# Altium schematic symbol library Analog Devices Data Converters Digital-to-Analog Converters.SchLib: 2231 symbols (part 58 of 135) (continued)
## AD5570ARS
designator U?
Single 16-Bit True Accuracy Digital-to-Analog Converter with Serial Interface, + / -12 V , + / -15 V, -40 to +85 degC, RS-16, Tube; Generic Part Number: AD5570; Manufacturer: Analog Devices; PartNumber: AD5570ARS; # DAC Outputs: 1; Max V+: 16.5V; Op Pwr Diss: 150mW; Resolution (Bits): 16; Settling Time: 12µs; Single Supply: No; DatasheetVersion: Rev.C; PackageVersion: Mar-2005; PackageReference: RS-16; PackageDescription: 16-Lead Shrink Small Outline Package [SSOP]; Supplier 1: Digi-Key; Supplier Part Number 1: AD5570ARS-ND; Supplier 2: Mouser; Supplier Part Number 2: 584-AD5570ARS; Packing: Tube; RoHS: N; Mounting Technology: Surface Mount; Code_JEDEC: MO-150-AC; ComponentLink1Description: Manufacturer URL; ComponentLink1URL: http://www.analog.com/en/index.html; ComponentLink2Description: Datasheet; ComponentLink2URL: http://www.analog.com/static/imported-files/data_sheets/AD5570.pdf; ComponentLink3Description: Package Specification; ComponentLink3URL: http://www.analog.com/static/imported-files/packages/31572257652246RS_16.pdf; ComponentLink4Description: Product URL; ComponentLink4URL: http://www.analog.com/en/digital-to-analog-converters/da-converters/ad5570/products/product.html
footprint RS-16_N (SOP, 16-Leads, Body 6.2x5.3mm, Pitch 0.65mm, IPC Medium Density)
footprint RS-16_L (SOP, 16-Leads, Body 6.2x5.3mm, Pitch 0.65mm, IPC High Density)
footprint RS-16_M (SOP, 16-Leads, Body 6.2x5.3mm, Pitch 0.65mm, IPC Low Density)
pins: 1 VSS (power) "Negative Analog Supply Voltage. -12 V +/- 5% to -15 V +/- 10% for specified performance", 2 VDD (power) "Positive Analog Supply Voltage. 12 V +/- 5% to 15 V +/- 10% for specified performance", 3 ~{CLR} (in) "Level Sensitive, Active Low Input. A falling edge of C\L\R\ resets VOUT to AGND. The contents of the registers are untouched.", 4 ~{LDAC} (in) "Active Low Control Input. Transfers the contents of the input register to the DAC register. L\D\A\C\ can be tied permanently low, enabling the outputs to be updated on the rising edge of S\Y\N\C\.", 5 ~{SYNC} (in) "Active Low Control Input. This is the frame synchronization signal for the data. When S\Y\N\C\ goes low, it powers on the SCLK and SDIN buffers and enables the input shift register. Data is transferred in on the falling (See Datasheet)", 6 SCLK (in) "Serial Clock Input. Data is clocked into the input register on the falling edge of the serial clock input. Data can be transferred at rates of up to 8 MHz.", 7 SDIN (in) "Serial Data Input. Data is clocked into the 16-bit register on the falling edge of the serial clock input.", 8 SDO (oc) "Serial Data Output. Can be used for daisy-chaining a number of devices together or for reading back the data in the shift register for diagnostic purposes. This is an open-drain output; it must be pulled to logic high with (See Datasheet)", 9 DGND (power) "Digital Ground. Ground reference for all digital circuitry.", 10 ~{PD} (in) "Active Low Control Input. Allows the DAC to be put into a power-down state.", 11 AGND (power) "Analog Ground. Ground reference for all analog circuitry.", 12 AGNDS (power) "Analog Ground Sense. This is normally tied to AGND.", 13 VOUT (out) "Analog Output Voltage.", 14 REFGND (power) "Reference Ground. Tie this pin to 0 V.", 15 REFIN (in) "Voltage Reference Input. This is internally buffered before being applied to the DAC. For bipolar +/-10 V output range, REFIN is 5 V.", 16 REFGND (power) "Reference Ground. Tie this pin to 0 V."

## AD5570ARS-REEL
designator U?
Single 16-Bit True Accuracy Digital-to-Analog Converter with Serial Interface, + / -12 V , + / -15 V, -40 to +85 degC, RS-16, Reel; Generic Part Number: AD5570; Manufacturer: Analog Devices; PartNumber: AD5570ARS-REEL; # DAC Outputs: 1; Max V+: 16.5V; Op Pwr Diss: 150mW; Resolution (Bits): 16; Settling Time: 12µs; Single Supply: No; DatasheetVersion: Rev.C; PackageVersion: Mar-2005; PackageReference: RS-16; PackageDescription: 16-Lead Shrink Small Outline Package [SSOP]; Supplier 1: Digi-Key; Supplier Part Number 1: AD5570ARS-REEL-ND; Supplier 2: Mouser; Supplier Part Number 2: 584-AD5570ARS-R; Packing: Reel; RoHS: N; Mounting Technology: Surface Mount; Code_JEDEC: MO-150-AC; ComponentLink1Description: Manufacturer URL; ComponentLink1URL: http://www.analog.com/en/index.html; ComponentLink2Description: Datasheet; ComponentLink2URL: http://www.analog.com/static/imported-files/data_sheets/AD5570.pdf; ComponentLink3Description: Package Specification; ComponentLink3URL: http://www.analog.com/static/imported-files/packages/31572257652246RS_16.pdf; ComponentLink4Description: Product URL; ComponentLink4URL: http://www.analog.com/en/digital-to-analog-converters/da-converters/ad5570/products/product.html
footprint RS-16_N (SOP, 16-Leads, Body 6.2x5.3mm, Pitch 0.65mm, IPC Medium Density)
footprint RS-16_L (SOP, 16-Leads, Body 6.2x5.3mm, Pitch 0.65mm, IPC High Density)
footprint RS-16_M (SOP, 16-Leads, Body 6.2x5.3mm, Pitch 0.65mm, IPC Low Density)
pins: 1 VSS (power) "Negative Analog Supply Voltage. -12 V +/- 5% to -15 V +/- 10% for specified performance", 2 VDD (power) "Positive Analog Supply Voltage. 12 V +/- 5% to 15 V +/- 10% for specified performance", 3 ~{CLR} (in) "Level Sensitive, Active Low Input. A falling edge of C\L\R\ resets VOUT to AGND. The contents of the registers are untouched.", 4 ~{LDAC} (in) "Active Low Control Input. Transfers the contents of the input register to the DAC register. L\D\A\C\ can be tied permanently low, enabling the outputs to be updated on the rising edge of S\Y\N\C\.", 5 ~{SYNC} (in) "Active Low Control Input. This is the frame synchronization signal for the data. When S\Y\N\C\ goes low, it powers on the SCLK and SDIN buffers and enables the input shift register. Data is transferred in on the falling (See Datasheet)", 6 SCLK (in) "Serial Clock Input. Data is clocked into the input register on the falling edge of the serial clock input. Data can be transferred at rates of up to 8 MHz.", 7 SDIN (in) "Serial Data Input. Data is clocked into the 16-bit register on the falling edge of the serial clock input.", 8 SDO (oc) "Serial Data Output. Can be used for daisy-chaining a number of devices together or for reading back the data in the shift register for diagnostic purposes. This is an open-drain output; it must be pulled to logic high with (See Datasheet)", 9 DGND (power) "Digital Ground. Ground reference for all digital circuitry.", 10 ~{PD} (in) "Active Low Control Input. Allows the DAC to be put into a power-down state.", 11 AGND (power) "Analog Ground. Ground reference for all analog circuitry.", 12 AGNDS (power) "Analog Ground Sense. This is normally tied to AGND.", 13 VOUT (out) "Analog Output Voltage.", 14 REFGND (power) "Reference Ground. Tie this pin to 0 V.", 15 REFIN (in) "Voltage Reference Input. This is internally buffered before being applied to the DAC. For bipolar +/-10 V output range, REFIN is 5 V.", 16 REFGND (power) "Reference Ground. Tie this pin to 0 V."

## AD5570ARSZ
designator U?
Single 16-Bit True Accuracy Digital-to-Analog Converter with Serial Interface, + / -12 V , + / -15 V, -40 to +85 degC, RS-16, Pb-Free, Tube; Generic Part Number: AD5570; Manufacturer: Analog Devices; PartNumber: AD5570ARSZ; # DAC Outputs: 1; Max V+: 16.5V; Op Pwr Diss: 150mW; Resolution (Bits): 16; Settling Time: 12µs; Single Supply: No; DatasheetVersion: Rev.C; PackageVersion: Mar-2005; PackageReference: RS-16; PackageDescription: 16-Lead Shrink Small Outline Package [SSOP]; Supplier 1: Digi-Key; Supplier Part Number 1: AD5570ARSZ-ND; Supplier 2: Farnell; Supplier Part Number 2: 2313472; Supplier 3: Newark; Supplier Part Number 3: 59K4235; Supplier 4: Mouser; Supplier Part Number 4: 584-AD5570ARSZ; Packing: Tube; RoHS: Y; Mounting Technology: Surface Mount; Code_JEDEC: MO-150-AC; ComponentLink1Description: Manufacturer URL; ComponentLink1URL: http://www.analog.com/en/index.html; ComponentLink2Description: Datasheet; ComponentLink2URL: http://www.analog.com/static/imported-files/data_sheets/AD5570.pdf; ComponentLink3Description: Package Specification; ComponentLink3URL: http://www.analog.com/static/imported-files/packages/31572257652246RS_16.pdf; ComponentLink4Description: Product URL; ComponentLink4URL: http://www.analog.com/en/digital-to-analog-converters/da-converters/ad5570/products/product.html
footprint RS-16_N (SOP, 16-Leads, Body 6.2x5.3mm, Pitch 0.65mm, IPC Medium Density)
footprint RS-16_L (SOP, 16-Leads, Body 6.2x5.3mm, Pitch 0.65mm, IPC High Density)
footprint RS-16_M (SOP, 16-Leads, Body 6.2x5.3mm, Pitch 0.65mm, IPC Low Density)
pins: 1 VSS (power) "Negative Analog Supply Voltage. -12 V +/- 5% to -15 V +/- 10% for specified performance", 2 VDD (power) "Positive Analog Supply Voltage. 12 V +/- 5% to 15 V +/- 10% for specified performance", 3 ~{CLR} (in) "Level Sensitive, Active Low Input. A falling edge of C\L\R\ resets VOUT to AGND. The contents of the registers are untouched.", 4 ~{LDAC} (in) "Active Low Control Input. Transfers the contents of the input register to the DAC register. L\D\A\C\ can be tied permanently low, enabling the outputs to be updated on the rising edge of S\Y\N\C\.", 5 ~{SYNC} (in) "Active Low Control Input. This is the frame synchronization signal for the data. When S\Y\N\C\ goes low, it powers on the SCLK and SDIN buffers and enables the input shift register. Data is transferred in on the falling (See Datasheet)", 6 SCLK (in) "Serial Clock Input. Data is clocked into the input register on the falling edge of the serial clock input. Data can be transferred at rates of up to 8 MHz.", 7 SDIN (in) "Serial Data Input. Data is clocked into the 16-bit register on the falling edge of the serial clock input.", 8 SDO (oc) "Serial Data Output. Can be used for daisy-chaining a number of devices together or for reading back the data in the shift register for diagnostic purposes. This is an open-drain output; it must be pulled to logic high with (See Datasheet)", 9 DGND (power) "Digital Ground. Ground reference for all digital circuitry.", 10 ~{PD} (in) "Active Low Control Input. Allows the DAC to be put into a power-down state.", 11 AGND (power) "Analog Ground. Ground reference for all analog circuitry.", 12 AGNDS (power) "Analog Ground Sense. This is normally tied to AGND.", 13 VOUT (out) "Analog Output Voltage.", 14 REFGND (power) "Reference Ground. Tie this pin to 0 V.", 15 REFIN (in) "Voltage Reference Input. This is internally buffered before being applied to the DAC. For bipolar +/-10 V output range, REFIN is 5 V.", 16 REFGND (power) "Reference Ground. Tie this pin to 0 V."

## AD5570ARSZ-REEL
designator U?
Single 16-Bit True Accuracy Digital-to-Analog Converter with Serial Interface, + / -12 V , + / -15 V, -40 to +85 degC, RS-16, Pb-Free, Reel; Generic Part Number: AD5570; Manufacturer: Analog Devices; PartNumber: AD5570ARSZ-REEL; # DAC Outputs: 1; Max V+: 16.5V; Op Pwr Diss: 150mW; Resolution (Bits): 16; Settling Time: 12µs; Single Supply: No; DatasheetVersion: Rev.C; PackageVersion: Mar-2005; PackageReference: RS-16; PackageDescription: 16-Lead Shrink Small Outline Package [SSOP]; Supplier 1: Digi-Key; Supplier Part Number 1: AD5570ARSZ-REEL-ND; Supplier 2: Mouser; Supplier Part Number 2: 584-AD5570ARSZ-R; Packing: Reel; RoHS: Y; Mounting Technology: Surface Mount; Code_JEDEC: MO-150-AC; ComponentLink1Description: Manufacturer URL; ComponentLink1URL: http://www.analog.com/en/index.html; ComponentLink2Description: Datasheet; ComponentLink2URL: http://www.analog.com/static/imported-files/data_sheets/AD5570.pdf; ComponentLink3Description: Package Specification; ComponentLink3URL: http://www.analog.com/static/imported-files/packages/31572257652246RS_16.pdf; ComponentLink4Description: Product URL; ComponentLink4URL: http://www.analog.com/en/digital-to-analog-converters/da-converters/ad5570/products/product.html
footprint RS-16_N (SOP, 16-Leads, Body 6.2x5.3mm, Pitch 0.65mm, IPC Medium Density)
footprint RS-16_L (SOP, 16-Leads, Body 6.2x5.3mm, Pitch 0.65mm, IPC High Density)
footprint RS-16_M (SOP, 16-Leads, Body 6.2x5.3mm, Pitch 0.65mm, IPC Low Density)
pins: 1 VSS (power) "Negative Analog Supply Voltage. -12 V +/- 5% to -15 V +/- 10% for specified performance", 2 VDD (power) "Positive Analog Supply Voltage. 12 V +/- 5% to 15 V +/- 10% for specified performance", 3 ~{CLR} (in) "Level Sensitive, Active Low Input. A falling edge of C\L\R\ resets VOUT to AGND. The contents of the registers are untouched.", 4 ~{LDAC} (in) "Active Low Control Input. Transfers the contents of the input register to the DAC register. L\D\A\C\ can be tied permanently low, enabling the outputs to be updated on the rising edge of S\Y\N\C\.", 5 ~{SYNC} (in) "Active Low Control Input. This is the frame synchronization signal for the data. When S\Y\N\C\ goes low, it powers on the SCLK and SDIN buffers and enables the input shift register. Data is transferred in on the falling (See Datasheet)", 6 SCLK (in) "Serial Clock Input. Data is clocked into the input register on the falling edge of the serial clock input. Data can be transferred at rates of up to 8 MHz.", 7 SDIN (in) "Serial Data Input. Data is clocked into the 16-bit register on the falling edge of the serial clock input.", 8 SDO (oc) "Serial Data Output. Can be used for daisy-chaining a number of devices together or for reading back the data in the shift register for diagnostic purposes. This is an open-drain output; it must be pulled to logic high with (See Datasheet)", 9 DGND (power) "Digital Ground. Ground reference for all digital circuitry.", 10 ~{PD} (in) "Active Low Control Input. Allows the DAC to be put into a power-down state.", 11 AGND (power) "Analog Ground. Ground reference for all analog circuitry.", 12 AGNDS (power) "Analog Ground Sense. This is normally tied to AGND.", 13 VOUT (out) "Analog Output Voltage.", 14 REFGND (power) "Reference Ground. Tie this pin to 0 V.", 15 REFIN (in) "Voltage Reference Input. This is internally buffered before being applied to the DAC. For bipolar +/-10 V output range, REFIN is 5 V.", 16 REFGND (power) "Reference Ground. Tie this pin to 0 V."

## AD5570ARSZ-REEL7
designator U?
Single 16-Bit True Accuracy Digital-to-Analog Converter with Serial Interface, + / -12 V , + / -15 V, -40 to +85 degC, RS-16, Pb-Free, Reel; Generic Part Number: AD5570; Manufacturer: Analog Devices; PartNumber: AD5570ARSZ-REEL7; # DAC Outputs: 1; Max V+: 16.5V; Op Pwr Diss: 150mW; Resolution (Bits): 16; Settling Time: 12µs; Single Supply: No; DatasheetVersion: Rev.C; PackageVersion: Mar-2005; PackageReference: RS-16; PackageDescription: 16-Lead Shrink Small Outline Package [SSOP]; Supplier 1: Digi-Key; Supplier Part Number 1: AD5570ARSZ-REEL7-ND; Supplier 2: Newark; Supplier Part Number 2: 59K4237; Supplier 3: Mouser; Supplier Part Number 3: 584-AD5570ARSZ-R7; Packing: Reel; RoHS: Y; Mounting Technology: Surface Mount; Code_JEDEC: MO-150-AC; ComponentLink1Description: Manufacturer URL; ComponentLink1URL: http://www.analog.com/en/index.html; ComponentLink2Description: Datasheet; ComponentLink2URL: http://www.analog.com/static/imported-files/data_sheets/AD5570.pdf; ComponentLink3Description: Package Specification; ComponentLink3URL: http://www.analog.com/static/imported-files/packages/31572257652246RS_16.pdf; ComponentLink4Description: Product URL; ComponentLink4URL: http://www.analog.com/en/digital-to-analog-converters/da-converters/ad5570/products/product.html
footprint RS-16_N (SOP, 16-Leads, Body 6.2x5.3mm, Pitch 0.65mm, IPC Medium Density)
footprint RS-16_L (SOP, 16-Leads, Body 6.2x5.3mm, Pitch 0.65mm, IPC High Density)
footprint RS-16_M (SOP, 16-Leads, Body 6.2x5.3mm, Pitch 0.65mm, IPC Low Density)
pins: 1 VSS (power) "Negative Analog Supply Voltage. -12 V +/- 5% to -15 V +/- 10% for specified performance", 2 VDD (power) "Positive Analog Supply Voltage. 12 V +/- 5% to 15 V +/- 10% for specified performance", 3 ~{CLR} (in) "Level Sensitive, Active Low Input. A falling edge of C\L\R\ resets VOUT to AGND. The contents of the registers are untouched.", 4 ~{LDAC} (in) "Active Low Control Input. Transfers the contents of the input register to the DAC register. L\D\A\C\ can be tied permanently low, enabling the outputs to be updated on the rising edge of S\Y\N\C\.", 5 ~{SYNC} (in) "Active Low Control Input. This is the frame synchronization signal for the data. When S\Y\N\C\ goes low, it powers on the SCLK and SDIN buffers and enables the input shift register. Data is transferred in on the falling (See Datasheet)", 6 SCLK (in) "Serial Clock Input. Data is clocked into the input register on the falling edge of the serial clock input. Data can be transferred at rates of up to 8 MHz.", 7 SDIN (in) "Serial Data Input. Data is clocked into the 16-bit register on the falling edge of the serial clock input.", 8 SDO (oc) "Serial Data Output. Can be used for daisy-chaining a number of devices together or for reading back the data in the shift register for diagnostic purposes. This is an open-drain output; it must be pulled to logic high with (See Datasheet)", 9 DGND (power) "Digital Ground. Ground reference for all digital circuitry.", 10 ~{PD} (in) "Active Low Control Input. Allows the DAC to be put into a power-down state.", 11 AGND (power) "Analog Ground. Ground reference for all analog circuitry.", 12 AGNDS (power) "Analog Ground Sense. This is normally tied to AGND.", 13 VOUT (out) "Analog Output Voltage.", 14 REFGND (power) "Reference Ground. Tie this pin to 0 V.", 15 REFIN (in) "Voltage Reference Input. This is internally buffered before being applied to the DAC. For bipolar +/-10 V output range, REFIN is 5 V.", 16 REFGND (power) "Reference Ground. Tie this pin to 0 V."

## AD5570BRS
designator U?
Single 16-Bit True Accuracy Digital-to-Analog Converter with Serial Interface, + / -12 V , + / -15 V, -40 to +85 degC, RS-16, Tube; Generic Part Number: AD5570; Manufacturer: Analog Devices; PartNumber: AD5570BRS; # DAC Outputs: 1; Max V+: 16.5V; Op Pwr Diss: 150mW; Resolution (Bits): 16; Settling Time: 12µs; Single Supply: No; DatasheetVersion: Rev.C; PackageVersion: Mar-2005; PackageReference: RS-16; PackageDescription: 16-Lead Shrink Small Outline Package [SSOP]; Supplier 1: Digi-Key; Supplier Part Number 1: AD5570BRS-ND; Supplier 2: Mouser; Supplier Part Number 2: 584-AD5570BRS; Packing: Tube; RoHS: N; Mounting Technology: Surface Mount; Code_JEDEC: MO-150-AC; ComponentLink1Description: Manufacturer URL; ComponentLink1URL: http://www.analog.com/en/index.html; ComponentLink2Description: Datasheet; ComponentLink2URL: http://www.analog.com/static/imported-files/data_sheets/AD5570.pdf; ComponentLink3Description: Package Specification; ComponentLink3URL: http://www.analog.com/static/imported-files/packages/31572257652246RS_16.pdf; ComponentLink4Description: Product URL; ComponentLink4URL: http://www.analog.com/en/digital-to-analog-converters/da-converters/ad5570/products/product.html
footprint RS-16_N (SOP, 16-Leads, Body 6.2x5.3mm, Pitch 0.65mm, IPC Medium Density)
footprint RS-16_L (SOP, 16-Leads, Body 6.2x5.3mm, Pitch 0.65mm, IPC High Density)
footprint RS-16_M (SOP, 16-Leads, Body 6.2x5.3mm, Pitch 0.65mm, IPC Low Density)
pins: 1 VSS (power) "Negative Analog Supply Voltage. -12 V +/- 5% to -15 V +/- 10% for specified performance", 2 VDD (power) "Positive Analog Supply Voltage. 12 V +/- 5% to 15 V +/- 10% for specified performance", 3 ~{CLR} (in) "Level Sensitive, Active Low Input. A falling edge of C\L\R\ resets VOUT to AGND. The contents of the registers are untouched.", 4 ~{LDAC} (in) "Active Low Control Input. Transfers the contents of the input register to the DAC register. L\D\A\C\ can be tied permanently low, enabling the outputs to be updated on the rising edge of S\Y\N\C\.", 5 ~{SYNC} (in) "Active Low Control Input. This is the frame synchronization signal for the data. When S\Y\N\C\ goes low, it powers on the SCLK and SDIN buffers and enables the input shift register. Data is transferred in on the falling (See Datasheet)", 6 SCLK (in) "Serial Clock Input. Data is clocked into the input register on the falling edge of the serial clock input. Data can be transferred at rates of up to 8 MHz.", 7 SDIN (in) "Serial Data Input. Data is clocked into the 16-bit register on the falling edge of the serial clock input.", 8 SDO (oc) "Serial Data Output. Can be used for daisy-chaining a number of devices together or for reading back the data in the shift register for diagnostic purposes. This is an open-drain output; it must be pulled to logic high with (See Datasheet)", 9 DGND (power) "Digital Ground. Ground reference for all digital circuitry.", 10 ~{PD} (in) "Active Low Control Input. Allows the DAC to be put into a power-down state.", 11 AGND (power) "Analog Ground. Ground reference for all analog circuitry.", 12 AGNDS (power) "Analog Ground Sense. This is normally tied to AGND.", 13 VOUT (out) "Analog Output Voltage.", 14 REFGND (power) "Reference Ground. Tie this pin to 0 V.", 15 REFIN (in) "Voltage Reference Input. This is internally buffered before being applied to the DAC. For bipolar +/-10 V output range, REFIN is 5 V.", 16 REFGND (power) "Reference Ground. Tie this pin to 0 V."

## AD5570BRS-REEL
designator U?
Single 16-Bit True Accuracy Digital-to-Analog Converter with Serial Interface, + / -12 V , + / -15 V, -40 to +85 degC, RS-16, Reel; Generic Part Number: AD5570; Manufacturer: Analog Devices; PartNumber: AD5570BRS-REEL; # DAC Outputs: 1; Max V+: 16.5V; Op Pwr Diss: 150mW; Resolution (Bits): 16; Settling Time: 12µs; Single Supply: No; DatasheetVersion: Rev.C; PackageVersion: Mar-2005; PackageReference: RS-16; PackageDescription: 16-Lead Shrink Small Outline Package [SSOP]; Supplier 1: Digi-Key; Supplier Part Number 1: AD5570BRS-REEL-ND; Supplier 2: Mouser; Supplier Part Number 2: 584-AD5570BRS-R; Packing: Reel; RoHS: N; Mounting Technology: Surface Mount; Code_JEDEC: MO-150-AC; ComponentLink1Description: Manufacturer URL; ComponentLink1URL: http://www.analog.com/en/index.html; ComponentLink2Description: Datasheet; ComponentLink2URL: http://www.analog.com/static/imported-files/data_sheets/AD5570.pdf; ComponentLink3Description: Package Specification; ComponentLink3URL: http://www.analog.com/static/imported-files/packages/31572257652246RS_16.pdf; ComponentLink4Description: Product URL; ComponentLink4URL: http://www.analog.com/en/digital-to-analog-converters/da-converters/ad5570/products/product.html
footprint RS-16_N (SOP, 16-Leads, Body 6.2x5.3mm, Pitch 0.65mm, IPC Medium Density)
footprint RS-16_L (SOP, 16-Leads, Body 6.2x5.3mm, Pitch 0.65mm, IPC High Density)
footprint RS-16_M (SOP, 16-Leads, Body 6.2x5.3mm, Pitch 0.65mm, IPC Low Density)
pins: 1 VSS (power) "Negative Analog Supply Voltage. -12 V +/- 5% to -15 V +/- 10% for specified performance", 2 VDD (power) "Positive Analog Supply Voltage. 12 V +/- 5% to 15 V +/- 10% for specified performance", 3 ~{CLR} (in) "Level Sensitive, Active Low Input. A falling edge of C\L\R\ resets VOUT to AGND. The contents of the registers are untouched.", 4 ~{LDAC} (in) "Active Low Control Input. Transfers the contents of the input register to the DAC register. L\D\A\C\ can be tied permanently low, enabling the outputs to be updated on the rising edge of S\Y\N\C\.", 5 ~{SYNC} (in) "Active Low Control Input. This is the frame synchronization signal for the data. When S\Y\N\C\ goes low, it powers on the SCLK and SDIN buffers and enables the input shift register. Data is transferred in on the falling (See Datasheet)", 6 SCLK (in) "Serial Clock Input. Data is clocked into the input register on the falling edge of the serial clock input. Data can be transferred at rates of up to 8 MHz.", 7 SDIN (in) "Serial Data Input. Data is clocked into the 16-bit register on the falling edge of the serial clock input.", 8 SDO (oc) "Serial Data Output. Can be used for daisy-chaining a number of devices together or for reading back the data in the shift register for diagnostic purposes. This is an open-drain output; it must be pulled to logic high with (See Datasheet)", 9 DGND (power) "Digital Ground. Ground reference for all digital circuitry.", 10 ~{PD} (in) "Active Low Control Input. Allows the DAC to be put into a power-down state.", 11 AGND (power) "Analog Ground. Ground reference for all analog circuitry.", 12 AGNDS (power) "Analog Ground Sense. This is normally tied to AGND.", 13 VOUT (out) "Analog Output Voltage.", 14 REFGND (power) "Reference Ground. Tie this pin to 0 V.", 15 REFIN (in) "Voltage Reference Input. This is internally buffered before being applied to the DAC. For bipolar +/-10 V output range, REFIN is 5 V.", 16 REFGND (power) "Reference Ground. Tie this pin to 0 V."

## AD5570BRS-REEL7
designator U?
Single 16-Bit True Accuracy Digital-to-Analog Converter with Serial Interface, + / -12 V , + / -15 V, -40 to +85 degC, RS-16, Reel; Generic Part Number: AD5570; Manufacturer: Analog Devices; PartNumber: AD5570BRS-REEL7; # DAC Outputs: 1; Max V+: 16.5V; Op Pwr Diss: 150mW; Resolution (Bits): 16; Settling Time: 12µs; Single Supply: No; DatasheetVersion: Rev.C; PackageVersion: Mar-2005; PackageReference: RS-16; PackageDescription: 16-Lead Shrink Small Outline Package [SSOP]; Supplier 1: Digi-Key; Supplier Part Number 1: AD5570BRS-REEL7-ND; Supplier 2: Mouser; Supplier Part Number 2: 584-AD5570BRS-R7; Packing: Reel; RoHS: N; Mounting Technology: Surface Mount; Code_JEDEC: MO-150-AC; ComponentLink1Description: Manufacturer URL; ComponentLink1URL: http://www.analog.com/en/index.html; ComponentLink2Description: Datasheet; ComponentLink2URL: http://www.analog.com/static/imported-files/data_sheets/AD5570.pdf; ComponentLink3Description: Package Specification; ComponentLink3URL: http://www.analog.com/static/imported-files/packages/31572257652246RS_16.pdf; ComponentLink4Description: Product URL; ComponentLink4URL: http://www.analog.com/en/digital-to-analog-converters/da-converters/ad5570/products/product.html
footprint RS-16_N (SOP, 16-Leads, Body 6.2x5.3mm, Pitch 0.65mm, IPC Medium Density)
footprint RS-16_L (SOP, 16-Leads, Body 6.2x5.3mm, Pitch 0.65mm, IPC High Density)
footprint RS-16_M (SOP, 16-Leads, Body 6.2x5.3mm, Pitch 0.65mm, IPC Low Density)
pins: 1 VSS (power) "Negative Analog Supply Voltage. -12 V +/- 5% to -15 V +/- 10% for specified performance", 2 VDD (power) "Positive Analog Supply Voltage. 12 V +/- 5% to 15 V +/- 10% for specified performance", 3 ~{CLR} (in) "Level Sensitive, Active Low Input. A falling edge of C\L\R\ resets VOUT to AGND. The contents of the registers are untouched.", 4 ~{LDAC} (in) "Active Low Control Input. Transfers the contents of the input register to the DAC register. L\D\A\C\ can be tied permanently low, enabling the outputs to be updated on the rising edge of S\Y\N\C\.", 5 ~{SYNC} (in) "Active Low Control Input. This is the frame synchronization signal for the data. When S\Y\N\C\ goes low, it powers on the SCLK and SDIN buffers and enables the input shift register. Data is transferred in on the falling (See Datasheet)", 6 SCLK (in) "Serial Clock Input. Data is clocked into the input register on the falling edge of the serial clock input. Data can be transferred at rates of up to 8 MHz.", 7 SDIN (in) "Serial Data Input. Data is clocked into the 16-bit register on the falling edge of the serial clock input.", 8 SDO (oc) "Serial Data Output. Can be used for daisy-chaining a number of devices together or for reading back the data in the shift register for diagnostic purposes. This is an open-drain output; it must be pulled to logic high with (See Datasheet)", 9 DGND (power) "Digital Ground. Ground reference for all digital circuitry.", 10 ~{PD} (in) "Active Low Control Input. Allows the DAC to be put into a power-down state.", 11 AGND (power) "Analog Ground. Ground reference for all analog circuitry.", 12 AGNDS (power) "Analog Ground Sense. This is normally tied to AGND.", 13 VOUT (out) "Analog Output Voltage.", 14 REFGND (power) "Reference Ground. Tie this pin to 0 V.", 15 REFIN (in) "Voltage Reference Input. This is internally buffered before being applied to the DAC. For bipolar +/-10 V output range, REFIN is 5 V.", 16 REFGND (power) "Reference Ground. Tie this pin to 0 V."

## AD5570BRSZ
designator U?
Single 16-Bit True Accuracy Digital-to-Analog Converter with Serial Interface, + / -12 V , + / -15 V, -40 to +85 degC, RS-16, Pb-Free, Tube; Generic Part Number: AD5570; Manufacturer: Analog Devices; PartNumber: AD5570BRSZ; # DAC Outputs: 1; Max V+: 16.5V; Op Pwr Diss: 150mW; Resolution (Bits): 16; Settling Time: 12µs; Single Supply: No; DatasheetVersion: Rev.C; PackageVersion: Mar-2005; PackageReference: RS-16; PackageDescription: 16-Lead Shrink Small Outline Package [SSOP]; Supplier 1: Digi-Key; Supplier Part Number 1: AD5570BRSZ-ND; Supplier 2: Mouser; Supplier Part Number 2: 584-AD5570BRSZ; Packing: Tube; RoHS: Y; Mounting Technology: Surface Mount; Code_JEDEC: MO-150-AC; ComponentLink1Description: Manufacturer URL; ComponentLink1URL: http://www.analog.com/en/index.html; ComponentLink2Description: Datasheet; ComponentLink2URL: http://www.analog.com/static/imported-files/data_sheets/AD5570.pdf; ComponentLink3Description: Package Specification; ComponentLink3URL: http://www.analog.com/static/imported-files/packages/31572257652246RS_16.pdf; ComponentLink4Description: Product URL; ComponentLink4URL: http://www.analog.com/en/digital-to-analog-converters/da-converters/ad5570/products/product.html
footprint RS-16_N (SOP, 16-Leads, Body 6.2x5.3mm, Pitch 0.65mm, IPC Medium Density)
footprint RS-16_L (SOP, 16-Leads, Body 6.2x5.3mm, Pitch 0.65mm, IPC High Density)
footprint RS-16_M (SOP, 16-Leads, Body 6.2x5.3mm, Pitch 0.65mm, IPC Low Density)
pins: 1 VSS (power) "Negative Analog Supply Voltage. -12 V +/- 5% to -15 V +/- 10% for specified performance", 2 VDD (power) "Positive Analog Supply Voltage. 12 V +/- 5% to 15 V +/- 10% for specified performance", 3 ~{CLR} (in) "Level Sensitive, Active Low Input. A falling edge of C\L\R\ resets VOUT to AGND. The contents of the registers are untouched.", 4 ~{LDAC} (in) "Active Low Control Input. Transfers the contents of the input register to the DAC register. L\D\A\C\ can be tied permanently low, enabling the outputs to be updated on the rising edge of S\Y\N\C\.", 5 ~{SYNC} (in) "Active Low Control Input. This is the frame synchronization signal for the data. When S\Y\N\C\ goes low, it powers on the SCLK and SDIN buffers and enables the input shift register. Data is transferred in on the falling (See Datasheet)", 6 SCLK (in) "Serial Clock Input. Data is clocked into the input register on the falling edge of the serial clock input. Data can be transferred at rates of up to 8 MHz.", 7 SDIN (in) "Serial Data Input. Data is clocked into the 16-bit register on the falling edge of the serial clock input.", 8 SDO (oc) "Serial Data Output. Can be used for daisy-chaining a number of devices together or for reading back the data in the shift register for diagnostic purposes. This is an open-drain output; it must be pulled to logic high with (See Datasheet)", 9 DGND (power) "Digital Ground. Ground reference for all digital circuitry.", 10 ~{PD} (in) "Active Low Control Input. Allows the DAC to be put into a power-down state.", 11 AGND (power) "Analog Ground. Ground reference for all analog circuitry.", 12 AGNDS (power) "Analog Ground Sense. This is normally tied to AGND.", 13 VOUT (out) "Analog Output Voltage.", 14 REFGND (power) "Reference Ground. Tie this pin to 0 V.", 15 REFIN (in) "Voltage Reference Input. This is internally buffered before being applied to the DAC. For bipolar +/-10 V output range, REFIN is 5 V.", 16 REFGND (power) "Reference Ground. Tie this pin to 0 V."

## AD5570BRSZ-REEL
designator U?
Single 16-Bit True Accuracy Digital-to-Analog Converter with Serial Interface, + / -12 V , + / -15 V, -40 to +85 degC, RS-16, Pb-Free, Reel; Generic Part Number: AD5570; Manufacturer: Analog Devices; PartNumber: AD5570BRSZ-REEL; # DAC Outputs: 1; Max V+: 16.5V; Op Pwr Diss: 150mW; Resolution (Bits): 16; Settling Time: 12µs; Single Supply: No; DatasheetVersion: Rev.C; PackageVersion: Mar-2005; PackageReference: RS-16; PackageDescription: 16-Lead Shrink Small Outline Package [SSOP]; Supplier 1: Digi-Key; Supplier Part Number 1: AD5570BRSZ-REEL-ND; Packing: Reel; RoHS: Y; Mounting Technology: Surface Mount; Code_JEDEC: MO-150-AC; ComponentLink1Description: Manufacturer URL; ComponentLink1URL: http://www.analog.com/en/index.html; ComponentLink2Description: Datasheet; ComponentLink2URL: http://www.analog.com/static/imported-files/data_sheets/AD5570.pdf; ComponentLink3Description: Package Specification; ComponentLink3URL: http://www.analog.com/static/imported-files/packages/31572257652246RS_16.pdf; ComponentLink4Description: Product URL; ComponentLink4URL: http://www.analog.com/en/digital-to-analog-converters/da-converters/ad5570/products/product.html
footprint RS-16_N (SOP, 16-Leads, Body 6.2x5.3mm, Pitch 0.65mm, IPC Medium Density)
footprint RS-16_L (SOP, 16-Leads, Body 6.2x5.3mm, Pitch 0.65mm, IPC High Density)
footprint RS-16_M (SOP, 16-Leads, Body 6.2x5.3mm, Pitch 0.65mm, IPC Low Density)
pins: 1 VSS (power) "Negative Analog Supply Voltage. -12 V +/- 5% to -15 V +/- 10% for specified performance", 2 VDD (power) "Positive Analog Supply Voltage. 12 V +/- 5% to 15 V +/- 10% for specified performance", 3 ~{CLR} (in) "Level Sensitive, Active Low Input. A falling edge of C\L\R\ resets VOUT to AGND. The contents of the registers are untouched.", 4 ~{LDAC} (in) "Active Low Control Input. Transfers the contents of the input register to the DAC register. L\D\A\C\ can be tied permanently low, enabling the outputs to be updated on the rising edge of S\Y\N\C\.", 5 ~{SYNC} (in) "Active Low Control Input. This is the frame synchronization signal for the data. When S\Y\N\C\ goes low, it powers on the SCLK and SDIN buffers and enables the input shift register. Data is transferred in on the falling (See Datasheet)", 6 SCLK (in) "Serial Clock Input. Data is clocked into the input register on the falling edge of the serial clock input. Data can be transferred at rates of up to 8 MHz.", 7 SDIN (in) "Serial Data Input. Data is clocked into the 16-bit register on the falling edge of the serial clock input.", 8 SDO (oc) "Serial Data Output. Can be used for daisy-chaining a number of devices together or for reading back the data in the shift register for diagnostic purposes. This is an open-drain output; it must be pulled to logic high with (See Datasheet)", 9 DGND (power) "Digital Ground. Ground reference for all digital circuitry.", 10 ~{PD} (in) "Active Low Control Input. Allows the DAC to be put into a power-down state.", 11 AGND (power) "Analog Ground. Ground reference for all analog circuitry.", 12 AGNDS (power) "Analog Ground Sense. This is normally tied to AGND.", 13 VOUT (out) "Analog Output Voltage.", 14 REFGND (power) "Reference Ground. Tie this pin to 0 V.", 15 REFIN (in) "Voltage Reference Input. This is internally buffered before being applied to the DAC. For bipolar +/-10 V output range, REFIN is 5 V.", 16 REFGND (power) "Reference Ground. Tie this pin to 0 V."